# Altium footprint library lamp_controller.PcbLib: 67 footprints (part 5 of 5)
Each footprint in its own frame and in the unit in brackets; x right, y up, seen from the top. Pads: shape width x height; smd on the part's side, far side on the other; paste and mask are expansions set on the pad; w line width, h text height; cw(c..) or ccw(c..) is an arc to the next point about the centre after c.
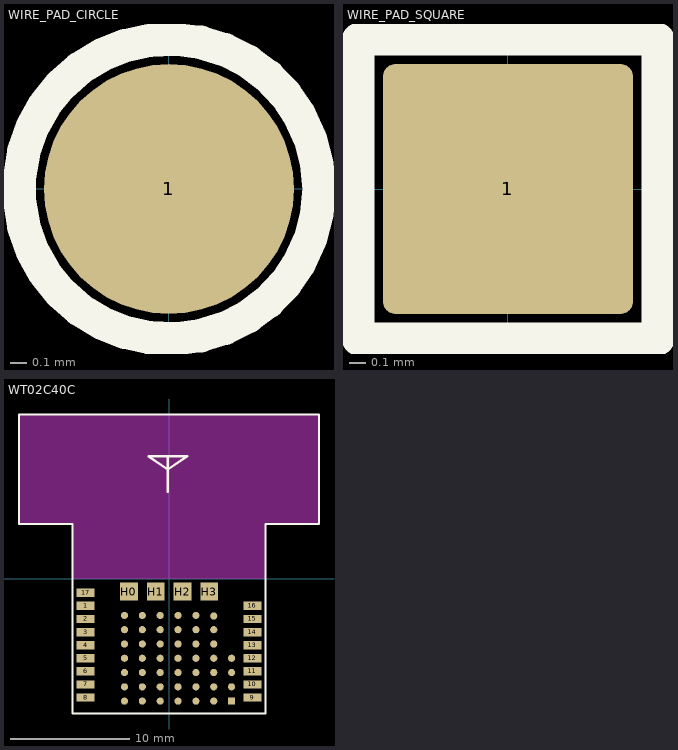
[diagram p4: the footprints below, top view; thin cyan lines are the x and y axes]

## WIRE_PAD_CIRCLE [mm]
pads (1):
  round 1.5 smd paste-2: 1(0,0)
Top Overlay:
  circle w0.2: c0,0 r0.9
3D body: height 0.1, standoff 0, extent -0.75,-0.749 0.744,0.749

## WIRE_PAD_SQUARE [mm]
pads (1):
  rrect10% 1.5x1.5 smd paste-2: 1(0,0)
Top Overlay:
  lines w0.2: -0.9,-0.9 -0.9,0.9 0.9,0.9 0.9,-0.9 -0.9,-0.9
3D body: height 0.1, standoff 0, extent -0.75,-0.75 0.75,0.75

## WT02C40C [mm] "nRF5340+nRF7002 BLE+WiFI module"
pads (67):
  rect 1.5x0.7 smd: 1(-7.003,-2.269) 2(-7.003,-3.369) 3(-7.003,-4.469) 4(-7.003,-5.569) 5(-7.003,-6.669) 6(-7.003,-7.769) 7(-7.003,-8.869) 8(-7.003,-9.969) 9(7.007,-9.969) 10(7.007,-8.869) 11(7.007,-7.769) 12(7.007,-6.669) 13(7.007,-5.569) 14(7.007,-4.469) 15(7.007,-3.369) 16(7.007,-2.269) 17(-7.003,-1.163)
  round 0.6 smd: A0(-2.24,-3.068) A1(-2.24,-4.268) A2(-2.24,-5.468) A3(-2.24,-6.668) A4(-2.24,-7.868) A5(-2.24,-9.068) A6(-2.24,-10.268) B0(-0.74,-3.068) B1(-0.74,-4.268) B2(-0.74,-5.468) B3(-0.74,-6.668) B4(-0.74,-7.868) B5(-0.74,-9.068) B6(-0.74,-10.268) C0(0.76,-3.068) C1(0.76,-4.268) C2(0.76,-5.468) C3(0.76,-6.668) C4(0.76,-7.868) C5(0.76,-9.068) C6(0.76,-10.268) D0(2.26,-3.068) D1(2.26,-4.268) D2(2.26,-5.468) D3(2.26,-6.668) D4(2.26,-7.868) D5(2.26,-9.068) D6(2.26,-10.268) E0(3.76,-3.117) E1(3.76,-4.268) E2(3.76,-5.468) E3(3.76,-6.668) E4(3.76,-7.868) E5(3.76,-9.068) E6(3.76,-10.268) F3(5.26,-6.668) F4(5.26,-7.868) F5(5.26,-9.068) Z0(-3.74,-3.068) Z1(-3.74,-4.268) Z2(-3.74,-5.468) Z3(-3.74,-6.668) Z4(-3.74,-7.868) Z5(-3.74,-9.068) Z6(-3.74,-10.268)
  rect 0.6x0.6 smd: F6(5.26,-10.268)
  rect 1.5x1.5 smd: H0(-3.365,-1.068) H1(-1.115,-1.068) H2(1.135,-1.068) H3(3.385,-1.068)
Top Overlay:
  lines w0.15: -12.6,4.6 -8.1,4.6 -8.1,-11.3 8.1,-11.3 8.1,4.6 12.6,4.6 12.6,13.8 -12.6,13.8 -12.6,4.6
  lines w0.2: -0.1,7.3 -0.1,10.3 ; -0.1,10.3 -1.725,10.3 -0.1,9.175 1.525,10.3 -0.1,10.3
Keep-Out Layer:
  region: -12.6,13.8 -12.6,4.6 -8.1,4.6 -8.1,0 8.1,0 8.1,4.6 12.6,4.6 12.6,13.8
Mechanical 7:
  text "No ground pad" at -2.901,9.275 h0.45
3D body "wt02c40c-v0_asm.stp": height 2, standoff 0, extent -12.5,-11.15 12.5,13.65